# Altium footprint library PWM_X2_SG3525.PcbLib: 1 footprints
Each footprint in its own frame and in the unit in brackets; x right, y up, seen from the top. Pads: shape width x height; smd on the part's side, far side on the other; paste and mask are expansions set on the pad; w line width, h text height; cw(c..) or ccw(c..) is an arc to the next point about the centre after c.
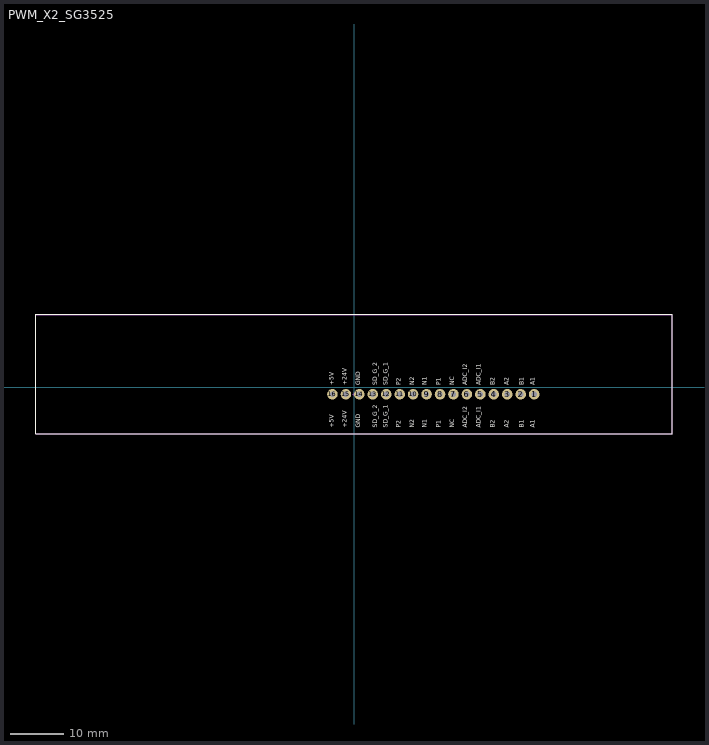
[diagram p0: the footprint, top view; thin cyan lines are the x and y axes]

## PWM_X2_SG3525 [mm]
pads (16):
  round 2 hole 1: 1(34,-1.3) 2(31.46,-1.3) 3(28.92,-1.3) 4(26.38,-1.3) 5(23.84,-1.3) 6(21.3,-1.3) 7(18.76,-1.3) 8(16.22,-1.3) 9(13.68,-1.3) 10(11.14,-1.3) 11(8.6,-1.3) 12(6.06,-1.3) 13(3.52,-1.3) 14(0.98,-1.3) 15(-1.56,-1.3) 16(-4.104,-1.3)
Top Overlay:
  lines w0.2: 60.075,13.775 60.075,-8.725 -60.125,-8.725 -60.125,13.8 60.075,13.8
  text "A1" at 34.146,-7.571 h0.8
  text "B1" at 31.996,-7.571 h0.8
  text "A2" at 29.246,-7.571 h0.8
  text "B2" at 26.571,-7.571 h0.8
  text "SD_G_1" at 6.345,-7.571 h0.8
  text "SD_G_2" at 4.321,-7.571 h0.8
  text "+5V" at -3.804,-7.571 h0.8
  text "+24V" at -1.354,-7.571 h0.8
  text "GND" at 1.171,-7.571 h0.8
  text "P1" at 16.321,-7.571 h0.8
  text "P2" at 8.821,-7.571 h0.8
  text "N1" at 13.746,-7.571 h0.8
  text "N2" at 11.346,-7.571 h0.8
  text "ADC_I1" at 23.913,-7.571 h0.8
  text "ADC_I2" at 21.388,-7.571 h0.8
  text "NC" at 18.896,-7.571 h0.8
  text "A1" at 34.146,0.454 h0.8
  text "B1" at 31.996,0.454 h0.8
  text "A2" at 29.246,0.454 h0.8
  text "B2" at 26.571,0.454 h0.8
  text "SD_G_1" at 6.345,0.454 h0.8
  text "SD_G_2" at 4.321,0.454 h0.8
  text "+5V" at -3.804,0.454 h0.8
  text "+24V" at -1.354,0.454 h0.8
  text "GND" at 1.171,0.454 h0.8
  text "P1" at 16.321,0.454 h0.8
  text "P2" at 8.821,0.454 h0.8
  text "N1" at 13.746,0.454 h0.8
  text "N2" at 11.346,0.454 h0.8
  text "ADC_I1" at 23.913,0.454 h0.8
  text "ADC_I2" at 21.388,0.454 h0.8
  text "NC" at 18.896,0.454 h0.8
Top Assembly:
  lines w0.1: -60.125,-8.725 -60.125,13.775 60.075,13.775 60.075,-8.725 -60.125,-8.725
  lines w0.2: -0.25,-1.3 0.25,-1.3 ; 0,-1.55 0,-1.05
  text "'.Designator'" at 0,-1.3 h0.7
3D body "Inverter_540VDC_V2.1.step": height 80, standoff -0.77, extent -60,-8.6 60,13.791